# Altium footprint library 10-Diobe.PcbLib: 108 footprints (part 6 of 7)
Each footprint in its own frame and in the unit in brackets; x right, y up, seen from the top. Pads: shape width x height; smd on the part's side, far side on the other; paste and mask are expansions set on the pad; w line width, h text height; cw(c..) or ccw(c..) is an arc to the next point about the centre after c.
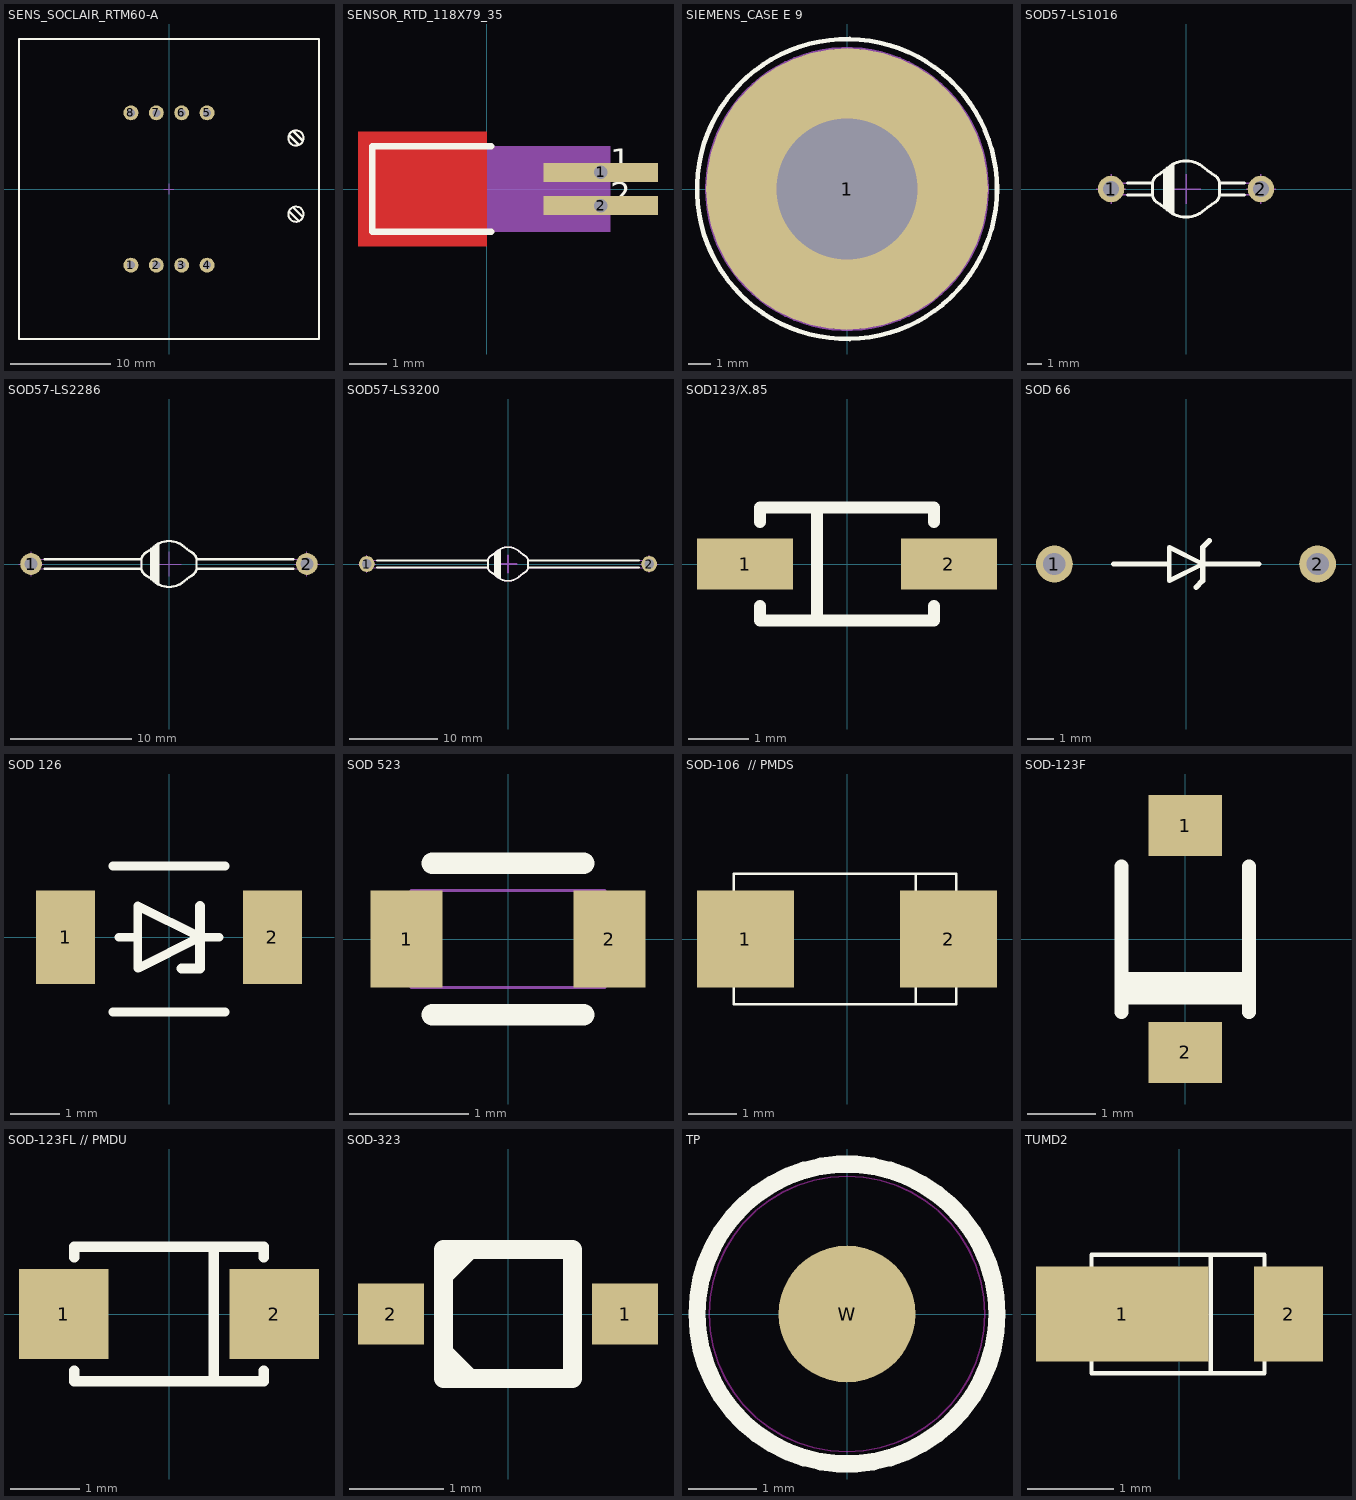
[diagram p5: the footprints below, top view; thin cyan lines are the x and y axes]

## SENS_SOCLAIR_RTM60-A [mm] "SOCLAIR RTM60 Transducer for Pt-100, Resistors"
height 15
pads (8):
  round 1.5 hole 0.8: 1(-3.81,-7.62) 2(-1.27,-7.62) 3(1.27,-7.62) 4(3.81,-7.62) 5(3.81,7.62) 6(1.27,7.62) 7(-1.27,7.62) 8(-3.81,7.62)
Top Overlay:
  circle w0.2: c12.7,-2.52 r0.76
  circle w0.2: c12.7,5.1 r0.76
  lines w0.2: 12.002,-2.218 13.002,-3.218 ; 12.002,5.402 13.002,4.402 ; 12.398,-1.822 13.398,-2.822 ; 12.398,5.798 13.398,4.798 ; -15,-15 -15,15 15,15 15,-15 -15,-15
Mechanical 8:
  lines w0.1: -4.31,-7.62 -3.81,-7.62 ; -4.31,7.62 -3.81,7.62 ; -3.81,-8.12 -3.81,-7.62 ; -3.81,-7.12 -3.81,-7.62 ; -3.81,7.12 -3.81,7.62 ; -3.81,8.12 -3.81,7.62 ; -3.31,-7.62 -3.81,-7.62 ; -3.31,7.62 -3.81,7.62 ; -1.77,-7.62 -1.27,-7.62 ; -1.77,7.62 -1.27,7.62 ; -1.27,-8.12 -1.27,-7.62 ; -1.27,-7.12 -1.27,-7.62 ; -1.27,7.12 -1.27,7.62 ; -1.27,8.12 -1.27,7.62 ; -0.77,-7.62 -1.27,-7.62 ; -0.77,7.62 -1.27,7.62 ; -0.5,0 0,0 ; 0,-0.5 0,0 ; 0,0.5 0,0 ; 0.5,0 0,0 ; 0.77,-7.62 1.27,-7.62 ; 0.77,7.62 1.27,7.62 ; 1.27,-8.12 1.27,-7.62 ; 1.27,-7.12 1.27,-7.62 ; 1.27,7.12 1.27,7.62 ; 1.27,8.12 1.27,7.62 ; 1.77,-7.62 1.27,-7.62 ; 1.77,7.62 1.27,7.62 ; 3.31,-7.62 3.81,-7.62 ; 3.31,7.62 3.81,7.62 ; 3.81,-8.12 3.81,-7.62 ; 3.81,-7.12 3.81,-7.62 ; 3.81,7.12 3.81,7.62 ; 3.81,8.12 3.81,7.62 ; 4.31,-7.62 3.81,-7.62 ; 4.31,7.62 3.81,7.62
Mechanical 14:
  circle w0.1: c12.7,-2.52 r0.76
  circle w0.1: c12.7,5.1 r0.76
  lines w0.1: 12.002,-2.218 13.002,-3.218 ; 12.002,5.402 13.002,4.402 ; 12.398,-1.822 13.398,-2.822 ; 12.398,5.798 13.398,4.798 ; -15,-15 -15,15 15,15 15,-15 -15,-15
3D body "SENS_SOCLAIR_RTM60-A.stp": height 15, standoff -3.6, extent -15,-15 15,15

## SENSOR_RTD_118X79_35 [mil] "SENSOR_RTD_118X79_35"
height 78.74
pads (2):
  rect 120x20 hole 14 mask+2.76: 1(120,17.5)
  rect 120x20 hole 14: 2(120,-17.5)
Top Layer:
  region: 0,60 0,-60 -135,-60 -135,60
Top Overlay:
  lines w7: 5,-45 -120,-45 -120,45 5,45
  text "2" at 130,-17.5 h25
  text "1" at 130,17.5 h25
  text "." at 30,340 h50
Mechanical 16:
  region: -120,45 130,45 130,-45 -120,-45
  lines w1: -113,-40 -113,40 5,40 5,-40 -113,-40
3D body "p300-050.stp": height 0.79, standoff 0, extent 60.95,-27.34 179.06,-7.65
3D body "p300-050.stp": height 0.79, standoff 0, extent 60.95,7.66 179.06,27.35

## SIEMENS_CASE E 9 [mm] "SIEMENS CASE E 9"
height 30.5
pads (1):
  round 12.4 hole 6.2: 1(0,0)
Top Overlay:
  circle w0.2: c0,0 r6.6
Mechanical 8:
  circle w0.1: c0,0 r3.1
  circle w0.1: c0,0 r6.2
  lines w0.1: -0.5,0 0,0 ; 0,-0.5 0,0 ; 0,0.5 0,0 ; 0.5,0 0,0
Mechanical 14:
  circle w0.1: c0,0 r5.25
  lines w0.1: -1,-0.75 cw(c0,0) 1,-0.75 ; -5.369,-3.1 -5.369,3.1 0,6.2 5.369,3.1 5.369,-3.1 0,-6.2 -5.369,-3.1 ; -1,-2.5 1,-2.5 1,0 ccw(c0,0) -1,0 -1,-2.5
3D body "SIEMENS_CASE E 9_Part2.stp": height -2.5, standoff -10.4, extent -6.2,-6.2 6.2,6.2
3D body "SIEMENS_CASE E 9_Part1.stp": height 30.5, standoff -11.5, extent -5.989,-5.989 5.989,5.989

## SOD57-LS1016 [mm] "Diode, Axial, Body L 4.57 x D 3.81 mm , Pin spacing 10.16mm"
height 2
pads (2):
  round 1.8 hole 1.1: 1(-5.08,0) 2(5.08,0)
Top Overlay:
  lines w0.2: -3.95,-0.4 -2.28,-0.4 ; -3.95,0.4 -2.28,0.4 ; -1.474,-1.244 -1.474,1.244 ; -1.274,-1.41 -1.274,1.41 ; -1.074,-1.568 -1.074,1.568 ; -0.874,-1.689 -0.874,1.689 ; 3.95,-0.4 2.28,-0.4 ; 3.95,0.4 2.28,0.4 ; -2.28,-0.4 ccw(c-1.512,-0.28) -1.883,-0.962 cw(c-2.839,-2.719) -1.681,-1.089 cw(c-4.575,-5.166) -1.26,-1.423 ccw(c0,0) -0.92,-1.663 -0.813,-1.723 ccw(c0,0) 0,-1.905 ccw(c0,0) 0.813,-1.723 0.92,-1.663 ccw(c0,0) 1.26,-1.423 cw(c4.575,-5.166) 1.681,-1.089 cw(c2.839,-2.719) 1.883,-0.962 ccw(c1.512,-0.28) 2.28,-0.4 ; -2.28,-0.4 -2.28,0 -2.28,0.4 ; -2.28,0.4 cw(c-1.512,0.28) -1.883,0.962 ccw(c-2.839,2.719) -1.681,1.089 ccw(c-4.575,5.166) -1.26,1.423 cw(c0,0) -0.92,1.663 -0.813,1.723 cw(c0,0) 0,1.905 cw(c0,0) 0.813,1.723 0.92,1.663 cw(c0,0) 1.26,1.423 ccw(c4.575,5.166) 1.681,1.089 ccw(c2.839,2.719) 1.883,0.962 cw(c1.512,0.28) 2.28,0.4 ; 2.28,-0.4 2.28,0 2.28,0.4
Mechanical 8:
  lines w0.1: -6.08,0 -5.08,0 ; -5.08,-1 -5.08,0 ; -5.08,1 -5.08,0 ; -4.08,0 -5.08,0 ; -1,0 0,0 ; 0,-1 0,0 ; 0,1 0,0 ; 1,0 0,0 ; 4.08,0 5.08,0 ; 5.08,-1 5.08,0 ; 5.08,1 5.08,0 ; 6.08,0 5.08,0
Mechanical 14:
  lines w0.1: -1.474,-1.244 -1.474,1.244 ; -1.274,-1.41 -1.274,1.41 ; -1.074,-1.568 -1.074,1.568 ; -0.874,-1.689 -0.874,1.689 ; -2.28,-0.4 ccw(c-1.512,-0.28) -1.883,-0.962 cw(c-2.839,-2.719) -1.681,-1.089 cw(c-4.575,-5.166) -1.26,-1.423 ccw(c0,0) -0.92,-1.663 -0.813,-1.723 ccw(c0,0) 0,-1.905 ccw(c0,0) 0.813,-1.723 0.92,-1.663 ccw(c0,0) 1.26,-1.423 cw(c4.575,-5.166) 1.681,-1.089 cw(c2.839,-2.719) 1.883,-0.962 ccw(c1.512,-0.28) 2.28,-0.4 ; -2.28,-0.4 -2.28,0 -2.28,0.4 ; -2.28,-0.4 -5.08,-0.4 cw(c-5.08,0) -5.08,0.4 -2.28,0.4 ; -2.28,0.4 cw(c-1.512,0.28) -1.883,0.962 ccw(c-2.839,2.719) -1.681,1.089 ccw(c-4.575,5.166) -1.26,1.423 cw(c0,0) -0.92,1.663 -0.813,1.723 cw(c0,0) 0,1.905 cw(c0,0) 0.813,1.723 0.92,1.663 cw(c0,0) 1.26,1.423 ccw(c4.575,5.166) 1.681,1.089 ccw(c2.839,2.719) 1.883,0.962 cw(c1.512,0.28) 2.28,0.4 ; 2.28,-0.4 2.28,0 2.28,0.4 ; 2.28,-0.4 5.08,-0.4 ccw(c5.08,0) 5.08,0.4 2.28,0.4
3D body "v150-090.stp": height 0.02, standoff -1.65, extent 4.33,-0.75 5.83,0.75
3D body "v150-090.stp": height 0.02, standoff -1.65, extent -5.83,-0.75 -4.33,0.75
3D body "SOD57-LS1016.stp": height 3.91, standoff -3, extent -5.475,-1.905 5.475,1.905

## SOD57-LS2286 [mm] "Diode, Axial, Body L 4.57 x D 3.81 mm , Pin spacing 22.86mm"
height 2
pads (2):
  round 1.8 hole 1.1: 1(-11.43,0) 2(11.43,0)
Top Overlay:
  lines w0.2: -10.3,-0.4 -2.28,-0.4 ; -10.3,0.4 -2.28,0.4 ; -1.474,-1.244 -1.474,1.244 ; -1.274,-1.41 -1.274,1.41 ; -1.074,-1.568 -1.074,1.568 ; -0.874,-1.689 -0.874,1.689 ; 10.3,-0.4 2.28,-0.4 ; 10.3,0.4 2.28,0.4 ; -2.28,-0.4 ccw(c-1.512,-0.28) -1.883,-0.962 cw(c-2.839,-2.719) -1.681,-1.089 cw(c-4.575,-5.166) -1.26,-1.423 ccw(c0,0) -0.92,-1.663 -0.813,-1.723 ccw(c0,0) 0,-1.905 ccw(c0,0) 0.813,-1.723 0.92,-1.663 ccw(c0,0) 1.26,-1.423 cw(c4.575,-5.166) 1.681,-1.089 cw(c2.839,-2.719) 1.883,-0.962 ccw(c1.512,-0.28) 2.28,-0.4 ; -2.28,-0.4 -2.28,0 -2.28,0.4 ; -2.28,0.4 cw(c-1.512,0.28) -1.883,0.962 ccw(c-2.839,2.719) -1.681,1.089 ccw(c-4.575,5.166) -1.26,1.423 cw(c0,0) -0.92,1.663 -0.813,1.723 cw(c0,0) 0,1.905 cw(c0,0) 0.813,1.723 0.92,1.663 cw(c0,0) 1.26,1.423 ccw(c4.575,5.166) 1.681,1.089 ccw(c2.839,2.719) 1.883,0.962 cw(c1.512,0.28) 2.28,0.4 ; 2.28,-0.4 2.28,0 2.28,0.4
Mechanical 8:
  lines w0.1: -12.43,0 -11.43,0 ; -11.43,-1 -11.43,0 ; -11.43,1 -11.43,0 ; -10.43,0 -11.43,0 ; -1,0 0,0 ; 0,-1 0,0 ; 0,1 0,0 ; 1,0 0,0 ; 10.43,0 11.43,0 ; 11.43,-1 11.43,0 ; 11.43,1 11.43,0 ; 12.43,0 11.43,0
Mechanical 14:
  lines w0.1: -1.474,-1.244 -1.474,1.244 ; -1.274,-1.41 -1.274,1.41 ; -1.074,-1.568 -1.074,1.568 ; -0.874,-1.689 -0.874,1.689 ; -2.28,-0.4 ccw(c-1.512,-0.28) -1.883,-0.962 cw(c-2.839,-2.719) -1.681,-1.089 cw(c-4.575,-5.166) -1.26,-1.423 ccw(c0,0) -0.92,-1.663 -0.813,-1.723 ccw(c0,0) 0,-1.905 ccw(c0,0) 0.813,-1.723 0.92,-1.663 ccw(c0,0) 1.26,-1.423 cw(c4.575,-5.166) 1.681,-1.089 cw(c2.839,-2.719) 1.883,-0.962 ccw(c1.512,-0.28) 2.28,-0.4 ; -2.28,-0.4 -11.43,-0.4 cw(c-11.43,0) -11.43,0.4 -2.28,0.4 ; -2.28,-0.4 -2.28,0 -2.28,0.4 ; -2.28,0.4 cw(c-1.512,0.28) -1.883,0.962 ccw(c-2.839,2.719) -1.681,1.089 ccw(c-4.575,5.166) -1.26,1.423 cw(c0,0) -0.92,1.663 -0.813,1.723 cw(c0,0) 0,1.905 cw(c0,0) 0.813,1.723 0.92,1.663 cw(c0,0) 1.26,1.423 ccw(c4.575,5.166) 1.681,1.089 ccw(c2.839,2.719) 1.883,0.962 cw(c1.512,0.28) 2.28,0.4 ; 2.28,-0.4 11.43,-0.4 ccw(c11.43,0) 11.43,0.4 2.28,0.4 ; 2.28,-0.4 2.28,0 2.28,0.4
3D body "v150-090.stp": height 0.02, standoff -1.65, extent 10.68,-0.75 12.18,0.75
3D body "v150-090.stp": height 0.02, standoff -1.65, extent -12.18,-0.75 -10.68,0.75
3D body "SOD57-LS2286.stp": height 3.91, standoff -3, extent -11.825,-1.905 11.825,1.905

## SOD57-LS3200 [mm] "Diode, Axial, Body L 4.57 x D 3.81 mm , Pin spacing 32mm"
height 2
pads (2):
  round 1.8 hole 1.1: 1(-16,0) 2(16,0)
Top Overlay:
  lines w0.2: -14.87,-0.4 -2.28,-0.4 ; -14.87,0.4 -2.28,0.4 ; -1.474,-1.244 -1.474,1.244 ; -1.274,-1.41 -1.274,1.41 ; -1.074,-1.568 -1.074,1.568 ; -0.874,-1.689 -0.874,1.689 ; 14.87,-0.4 2.28,-0.4 ; 14.87,0.4 2.28,0.4 ; -2.28,-0.4 ccw(c-1.512,-0.28) -1.883,-0.962 cw(c-2.839,-2.719) -1.681,-1.089 cw(c-4.575,-5.166) -1.26,-1.423 ccw(c0,0) -0.92,-1.663 -0.813,-1.723 ccw(c0,0) 0,-1.905 ccw(c0,0) 0.813,-1.723 0.92,-1.663 ccw(c0,0) 1.26,-1.423 cw(c4.575,-5.166) 1.681,-1.089 cw(c2.839,-2.719) 1.883,-0.962 ccw(c1.512,-0.28) 2.28,-0.4 ; -2.28,-0.4 -2.28,0 -2.28,0.4 ; -2.28,0.4 cw(c-1.512,0.28) -1.883,0.962 ccw(c-2.839,2.719) -1.681,1.089 ccw(c-4.575,5.166) -1.26,1.423 cw(c0,0) -0.92,1.663 -0.813,1.723 cw(c0,0) 0,1.905 cw(c0,0) 0.813,1.723 0.92,1.663 cw(c0,0) 1.26,1.423 ccw(c4.575,5.166) 1.681,1.089 ccw(c2.839,2.719) 1.883,0.962 cw(c1.512,0.28) 2.28,0.4 ; 2.28,-0.4 2.28,0 2.28,0.4
Mechanical 8:
  lines w0.1: -17,0 -16,0 ; -16,-1 -16,0 ; -16,1 -16,0 ; -15,0 -16,0 ; 15,0 16,0 ; 16,-1 16,0 ; 16,1 16,0 ; 17,0 16,0
  lines w0.2: -1,0 0,0 ; 0,-1 0,0 ; 0,1 0,0 ; 1,0 0,0
Mechanical 14:
  lines w0.1: -2.28,-0.4 -16,-0.4 cw(c-16,0) -16,0.4 -2.28,0.4 ; 2.28,-0.4 16,-0.4 ccw(c16,0) 16,0.4 2.28,0.4
  lines w0.2: -1.474,-1.244 -1.474,1.244 ; -1.274,-1.41 -1.274,1.41 ; -1.074,-1.568 -1.074,1.568 ; -0.874,-1.689 -0.874,1.689 ; -2.28,-0.4 ccw(c-1.512,-0.28) -1.883,-0.962 cw(c-2.839,-2.719) -1.681,-1.089 cw(c-4.575,-5.166) -1.26,-1.423 ccw(c0,0) -0.92,-1.663 -0.813,-1.723 ccw(c0,0) 0,-1.905 ccw(c0,0) 0.813,-1.723 0.92,-1.663 ccw(c0,0) 1.26,-1.423 cw(c4.575,-5.166) 1.681,-1.089 cw(c2.839,-2.719) 1.883,-0.962 ccw(c1.512,-0.28) 2.28,-0.4 2.28,0 2.28,0.4 ccw(c1.512,0.28) 1.883,0.962 cw(c2.839,2.719) 1.681,1.089 cw(c4.575,5.166) 1.26,1.423 ccw(c0,0) 0.92,1.663 0.813,1.723 ccw(c0,0) 0,1.905 ccw(c0,0) -0.813,1.723 -0.92,1.663 ccw(c0,0) -1.26,1.423 cw(c-4.575,5.166) -1.681,1.089 cw(c-2.839,2.719) -1.883,0.962 ccw(c-1.512,0.28) -2.28,0.4 -2.28,0 -2.28,-0.4
3D body "v150-090.stp": height 0.02, standoff -1.65, extent 15.25,-0.75 16.75,0.75
3D body "v150-090.stp": height 0.02, standoff -1.65, extent -16.75,-0.75 -15.25,0.75
3D body "SOD57-LS3200.stp": height 3.91, standoff -3, extent -16.395,-1.905 16.395,1.905

## SOD123/X.85 [mm] "SOD-123; 2 Leads; Body 2.7 x 1.6 mm, (LxW)"
height 1.35
pads (2):
  rect 1.6x0.85 smd: 1(-1.7,0)
  rect 1.6x0.85 smd mask+0.07: 2(1.7,0)
Top Overlay:
  lines w0.2: -1.45,-0.7 -1.45,-0.94 1.45,-0.94 1.45,-0.7 ; -1.45,0.7 -1.45,0.94 1.45,0.94 1.45,0.7 ; -0.5,-0.9 -0.5,0.9
3D body "f085-1_6.stp": height 0.02, standoff 0, extent 0.889,-0.425 2.489,0.425
3D body "f085-1_6.stp": height 0.02, standoff 0, extent -2.502,-0.425 -0.902,0.425
3D body "sod-123.stp": height 0.8, standoff 0, extent -1.75,-0.8 1.75,0.8

## SOD 66 [mm]
height 2
pads (2):
  round 1.4 hole 0.85: 1(-5,0)
  round 1.4 hole 0.85 mask+0.07: 2(5,0)
Top Overlay:
  lines w0.178: -2.769,0 -0.635,0 ; -0.635,-0.635 -0.635,0.635 0.635,0 -0.635,-0.635
  lines w0.2: 0.635,0 2.769,0
  lines w0.203: 0.381,-0.889 0.635,-0.635 0.635,0.635 0.889,0.889
3D body "sod-66_10mm.stp": height 3.21, standoff -2.5, extent -5.466,-1.606 5.334,1.606
3D body "v150-090.stp": height 0.02, standoff -1.65, extent -5.75,-0.75 -4.25,0.75
3D body "v150-090.stp": height 0.02, standoff -1.65, extent 4.25,-0.75 5.75,0.75

## SOD 126 [mm]
height 1.35
pads (2):
  rect 1.2x1.9 smd: 1(-2.1,0)
  rect 1.2x1.9 smd mask+0.07: 2(2.1,0)
Top Overlay:
  lines w0.178: -1.143,-1.524 1.143,-1.524 ; -1.143,1.448 1.143,1.448 ; -1.016,0 -0.635,0 ; 1.016,0 0.635,0 ; 0.635,0 -0.635,-0.635 -0.635,0.635 0.635,0
  lines w0.203: 0.254,-0.635 0.635,-0.635 0.635,0.635
3D body "1_2-1_9-sod126.stp": height 0.02, standoff 0, extent -2.695,-0.787 -1.495,0.813
3D body "1_2-1_9-sod126.stp": height 0.02, standoff 0, extent 1.496,-0.787 2.696,0.813
3D body "sod-126.stp": height 1.1, standoff 0.02, extent -2.6,-1.397 2.6,1.303

## SOD 523 [mm]
height 1.35
pads (2):
  rect 0.6x0.813 smd: 1(-0.85,0) 2(0.85,0)
Top Overlay:
  lines w0.178: -0.635,-0.635 0.635,-0.635 ; -0.635,0.635 0.635,0.635
Bottom Overlay:
Mechanical 15:
  lines w0.025: -0.813,-0.406 0.813,-0.406 0.813,0.406 -0.813,0.406 -0.813,-0.406
3D body "sc-79.stp": height 0.6, standoff 0, extent -0.826,-0.4 0.774,0.4
3D body "0_8128-0_762-0603.stp": height 0.02, standoff 0, extent 0.406,-0.406 1.168,0.406
3D body "0_8128-0_762-0603.stp": height 0.02, standoff 0, extent -1.168,-0.406 -0.406,0.406

## SOD-106  // PMDS [mm]
height 1.35
pads (2):
  rect 2x2 smd mask+0.051: 1(-2.1,0) 2(2.1,0)
Top Overlay:
  lines w0.025: -2.337,-0.813 -2.438,-0.813 -2.438,0.813 -2.337,0.813 ; 2.261,-0.813 2.362,-0.813 2.362,0.813 2.261,0.813
  lines w0.051: 1.422,-1.346 1.422,1.346 ; -2.337,-1.346 -2.337,1.346 2.261,1.346 2.261,-1.346 -2.337,-1.346
3D body "sod-106.stp": height 2, standoff 0, extent -2.389,-1.3 2.311,1.3
3D body "p200-150.stp": height 0.02, standoff 0, extent -3.139,-1 -1.639,1
3D body "p200-150.stp": height 0.02, standoff 0, extent 1.561,-1 3.061,1

## SOD-123F [mil]
height 53.15
pads (2):
  rect 42x35 smd: 1(0,65) 2(0,-65)
Top Overlay:
  rectangle: -35.63,-37.42 37.45,-19
  lines w8: -36.63,-41.88 -36.63,41.72 ; 36.45,-41.88 36.45,41.72
3D body "sod-123.stp": height 31.5, standoff 0, extent -31.5,-67.9 31.5,69.9
3D body "p090-080.stp": height 0.79, standoff 0, extent -17.72,-83.64 17.71,-52.15
3D body "p090-080.stp": height 0.79, standoff 0, extent -17.71,49.25 17.72,80.75

## SOD-123FL // PMDU [mm]
height 1.35
pads (2):
  rect 1.3x1.3 smd mask+0.051: 1(-1.525,0) 2(1.525,0)
Top Overlay:
  lines w0.15: -1.372,-0.825 -1.372,-0.975 1.372,-0.975 1.372,-0.825 ; -1.372,0.825 -1.372,0.975 1.372,0.975 1.372,0.825 ; 0.65,-0.925 0.65,0.975
3D body "sod-123.stp": height 0.8, standoff 0, extent -1.753,-0.813 1.747,0.787
3D body "1_2-1_9-sod126.stp": height 0.02, standoff 0, extent -2.184,-0.61 -0.584,0.59
3D body "1_2-1_9-sod126.stp": height 0.02, standoff 0, extent 0.584,-0.584 2.184,0.616

## SOD-323 [mm]
height 1.35
pads (2):
  rect 0.7x0.65 smd: 1(1.245,0) 2(-1.245,0)
Top Overlay:
  lines w0.203: -0.686,-0.406 -0.406,-0.686 ; -0.686,0.406 -0.406,0.686 ; -0.686,-0.686 -0.686,0.686 0.686,0.686 0.686,-0.686 -0.686,-0.686
3D body "sod-323.stp": height 1.11, standoff -0.07, extent -1.375,-0.675 1.375,0.675
3D body "0_65-0_4.stp": height 0.01, standoff 0, extent -1.575,-0.325 -1.175,0.325
3D body "0_65-0_4.stp": height 0.01, standoff 0, extent 1.175,-0.325 1.575,0.325

## TP [mm]
height 11.7
pads (1):
  round 2 smd mask+1: W(0,0)
Top Overlay:
  circle w0.254: c0,0 r2.195
Keep-Out Layer:
  circle w0.025: c0,0 r2.017
3D body "1_016-1_016-3_tp.stp": height 0.02, standoff 0, extent -1.5,-1.5 1.5,1.5

## TUMD2 [mm]
height 1.35
pads (2):
  rect 2x1.1 smd mask+0.051: 1(-0.66,0)
  rect 0.8x1.1 smd mask+0.051: 2(1.27,0)
Top Overlay:
  lines w0.025: -1.016,-0.432 -1.295,-0.432 -1.295,0.406 -1.016,0.406 ; 0.991,-0.432 1.27,-0.432 1.27,0.406 0.991,0.406
  lines w0.051: 0.368,-0.686 0.368,0.686 ; -1.016,-0.686 -1.016,0.686 0.991,0.686 0.991,-0.686 -1.016,-0.686
3D body "p110-080.stp": height 0.02, standoff 0, extent 0.87,-0.55 1.67,0.55
3D body "p200-110.stp": height 0.02, standoff 0, extent -1.66,-0.55 0.34,0.55
3D body "tumd2.stp": height 0.66, standoff 0, extent -1.255,-0.65 1.245,0.65